# Altium footprint library PCB_Connector.PcbLib: 65 footprints (part 4 of 5)
Each footprint in its own frame and in the unit in brackets; x right, y up, seen from the top. Pads: shape width x height; smd on the part's side, far side on the other; paste and mask are expansions set on the pad; w line width, h text height; cw(c..) or ccw(c..) is an arc to the next point about the centre after c.
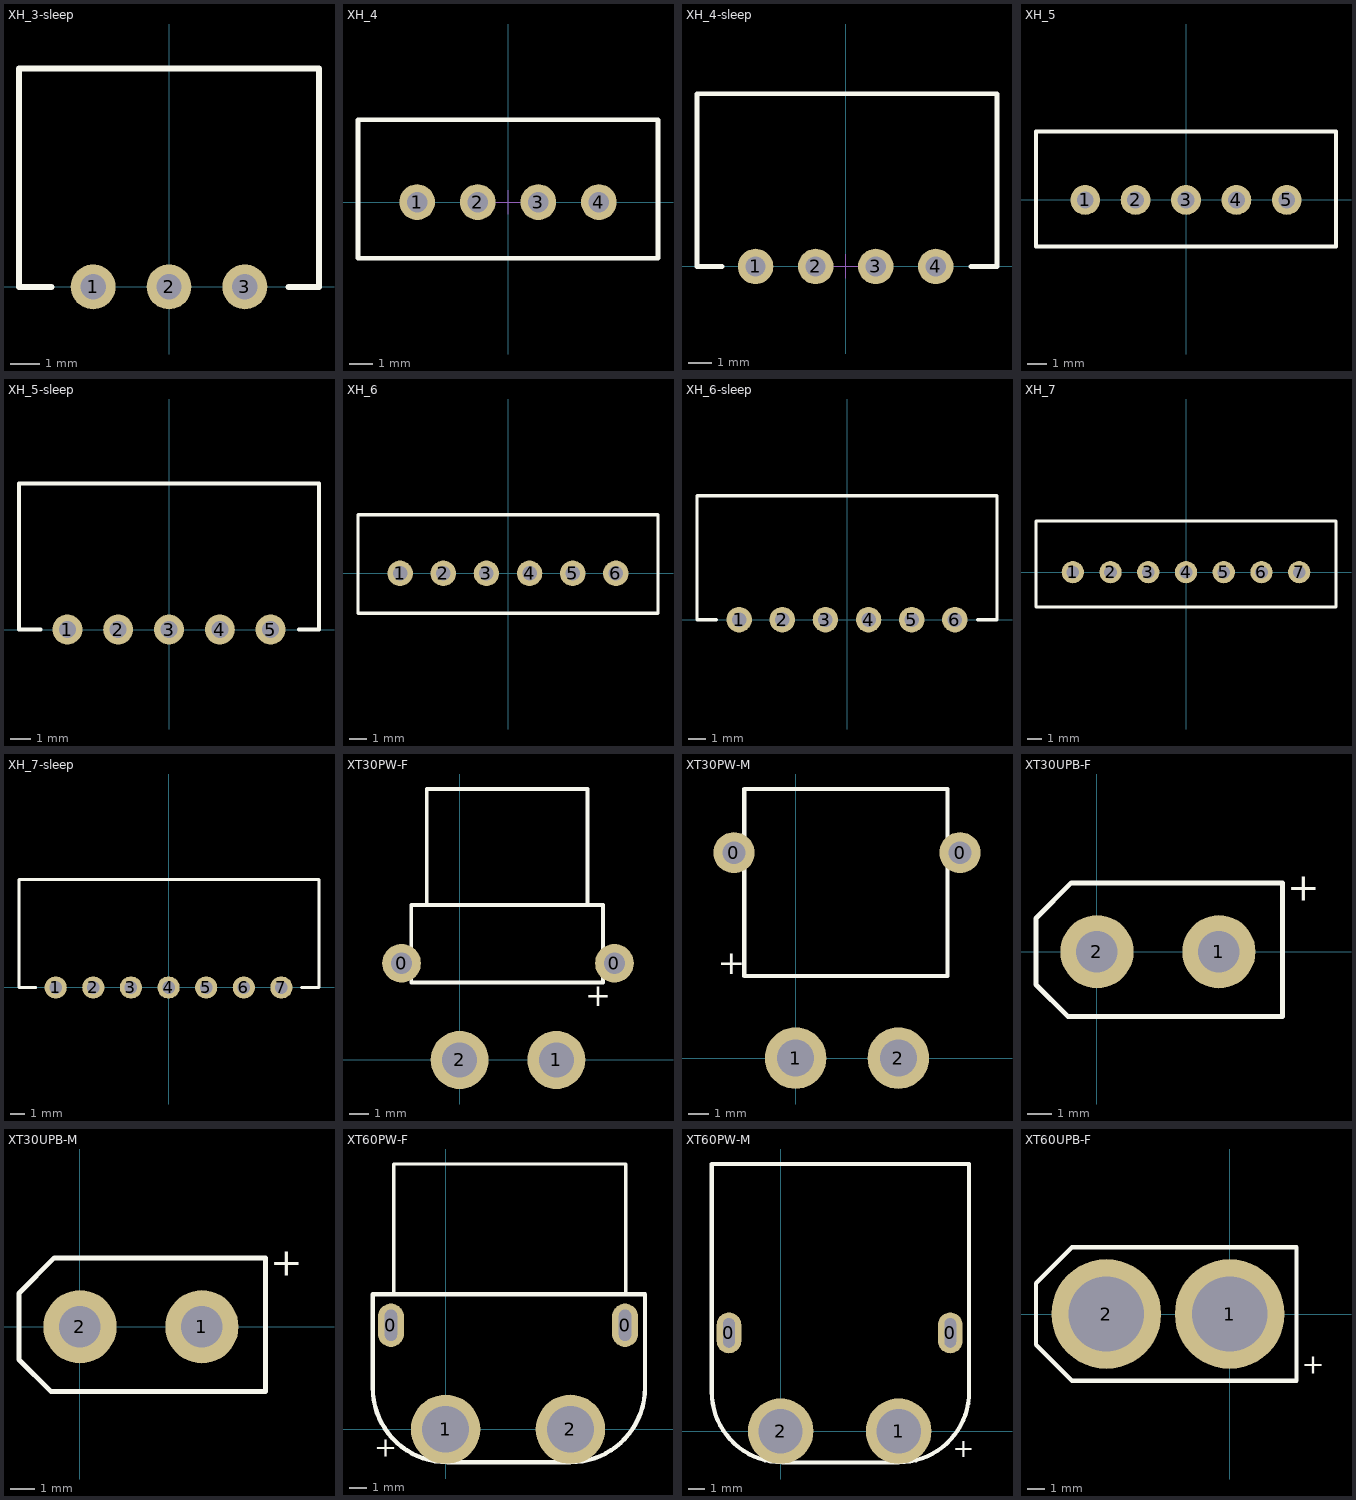
[diagram p3: the footprints below, top view; thin cyan lines are the x and y axes]

## XH_3-sleep [mm]
pads (3):
  round 1.5 hole 0.85: 1(-2.54,0) 2(0,0) 3(2.54,0)
Top Overlay:
  lines w0.2: -5.02,0 -5.02,7.3 5.02,7.3 5.02,0 ; -5,0 -3.93,0 ; 4,0 5,0
3D body "JST-XH-2.5mm-3P.STEP": height 5.95, standoff -3.35, extent -5,-0.34 5,7.3

## XH_4 [mm]
pads (4):
  round 1.5 hole 0.85: 1(-3.81,0) 2(-1.27,0) 3(1.27,0) 4(3.81,0)
Top Overlay:
  lines w0.2: -6.29,-2.35 6.29,-2.35 6.29,3.45 -6.29,3.45 -6.29,-2.35
Top Assembly (Mech13):
  lines w0.051: -0.508,0 0.508,0 ; 0,-0.508 0,0.508
3D body "XH(middle).STEP": height 7.2, standoff -3.2, extent 0,-2.35 2.54,3.45
3D body "XH(middle).STEP": height 7.2, standoff -3.2, extent -2.54,-2.35 0,3.45
3D body "XH(right).STEP": height 7.2, standoff -3.2, extent 2.54,-2.35 6.29,3.45
3D body "XH(left).STEP": height 7.2, standoff -3.2, extent -6.29,-2.35 -2.54,3.45

## XH_4-sleep [mm]
pads (4):
  round 1.5 hole 0.85: 1(-3.81,0) 2(-1.27,0) 3(1.27,0) 4(3.81,0)
Top Overlay:
  lines w0.2: -5.23,0 -6.29,0 -6.29,7.3 6.4,7.3 6.4,0 5.3,0
Top Assembly (Mech13):
  lines w0.051: -0.508,0 0.508,0 ; 0,-0.508 0,0.508
3D body: height 5.8, standoff 0, extent -6.3,0 6.3,7.3

## XH_5 [mm]
pads (5):
  round 1.5 hole 0.85: 1(-5.08,0) 2(-2.54,0) 3(0,0) 4(2.54,0) 5(5.08,0)
Top Overlay:
  lines w0.2: -7.56,-2.35 -7.56,3.45 7.56,3.45 7.56,-2.35 -7.56,-2.35
3D body "XH(left).STEP": height 7.2, standoff -3.2, extent -7.56,-2.35 -3.81,3.45
3D body "XH(right).STEP": height 7.2, standoff -3.2, extent 3.81,-2.35 7.56,3.45
3D body "XH(middle).STEP": height 7.2, standoff -3.2, extent -3.81,-2.35 -1.27,3.45
3D body "XH(middle).STEP": height 7.2, standoff -3.2, extent -1.27,-2.35 1.27,3.45
3D body "XH(middle).STEP": height 7.2, standoff -3.2, extent 1.27,-2.35 3.81,3.45

## XH_5-sleep [mm]
pads (5):
  round 1.5 hole 0.85: 1(-5.08,0) 2(-2.54,0) 3(0,0) 4(2.54,0) 5(5.08,0)
Top Overlay:
  lines w0.2: -6.43,0 -7.5,0 -7.5,7.3 7.5,7.3 7.5,0 6.5,0
3D body: height 5.8, standoff 0, extent -7.5,0 7.5,7.3

## XH_6 [mm]
pads (6):
  round 1.5 hole 0.85: 1(-6.35,0) 2(-3.81,0) 3(-1.27,0) 4(1.27,0) 5(3.81,0) 6(6.35,0)
Top Overlay:
  lines w0.2: -8.83,-2.35 -8.83,3.45 8.83,3.45 8.83,-2.35 -8.83,-2.35
3D body "XH(middle).STEP": height 7.2, standoff -3.2, extent 0,-2.35 2.54,3.45
3D body "XH(left).STEP": height 7.2, standoff -3.2, extent -8.83,-2.35 -5.08,3.45
3D body "XH(right).STEP": height 7.2, standoff -3.2, extent 5.08,-2.35 8.83,3.45
3D body "XH(middle).STEP": height 7.2, standoff -3.2, extent -5.08,-2.35 -2.54,3.45
3D body "XH(middle).STEP": height 7.2, standoff -3.2, extent -2.54,-2.35 0,3.45
3D body "XH(middle).STEP": height 7.2, standoff -3.2, extent 2.54,-2.35 5.08,3.45

## XH_6-sleep [mm]
pads (6):
  round 1.5 hole 0.85: 1(-6.35,0) 2(-3.81,0) 3(-1.27,0) 4(1.27,0) 5(3.81,0) 6(6.35,0)
Top Overlay:
  lines w0.2: -7.7,0 -8.83,0 -8.83,7.3 8.83,7.3 8.83,0 7.7,0
3D body: height 5.8, standoff 0, extent -8.8,0 8.8,7.3

## XH_7 [mm]
pads (7):
  round 1.5 hole 0.85: 1(-7.62,0) 2(-5.08,0) 3(-2.54,0) 4(0,0) 5(2.54,0) 6(5.08,0) 7(7.62,0)
Top Overlay:
  lines w0.2: -10.1,-2.35 10.1,-2.35 10.1,3.45 -10.1,3.45 -10.1,-2.35
3D body "XH(middle).STEP": height 7.2, standoff -3.2, extent 3.81,-2.35 6.35,3.45
3D body "XH(middle).STEP": height 7.2, standoff -3.2, extent 1.27,-2.35 3.81,3.45
3D body "XH(middle).STEP": height 7.2, standoff -3.2, extent -1.27,-2.35 1.27,3.45
3D body "XH(middle).STEP": height 7.2, standoff -3.2, extent -3.81,-2.35 -1.27,3.45
3D body "XH(middle).STEP": height 7.2, standoff -3.2, extent -6.35,-2.35 -3.81,3.45
3D body "XH(right).STEP": height 7.2, standoff -3.2, extent 6.35,-2.35 10.1,3.45
3D body "XH(left).STEP": height 7.2, standoff -3.2, extent -10.1,-2.35 -6.35,3.45

## XH_7-sleep [mm]
pads (7):
  round 1.5 hole 0.85: 1(-7.62,0) 2(-5.08,0) 3(-2.54,0) 4(0,0) 5(2.54,0) 6(5.08,0) 7(7.62,0)
Top Overlay:
  lines w0.2: -8.97,0 -10.1,0 -10.1,7.3 10.16,7.3 10.16,0 8.97,0
3D body: height 5.8, standoff 0, extent -10.07,0 10.16,7.3

## XT30PW-F [mm]
pads (4):
  round 2 hole 1.1: 0(-3,5) 0(8,5)
  round 3 hole 1.8: 1(5,0) 2(0,0)
Top Overlay:
  lines w0.2: -1.7,8 -1.7,14 6.6,14 6.6,8 ; -2.5,4 -2.5,8 7.4,8 7.4,4 -2.5,4
  text "+" at 6.5,2.4 h2
3D body "XT30PW-F.STEP": height 5.1, standoff -2.05, extent -4.15,-0.9 9.15,14

## XT30PW-M [mm]
pads (4):
  round 2 hole 1.1: 0(-3,10) 0(8,10)
  round 3 hole 1.8: 1(0,0) 2(5,0)
Top Overlay:
  lines w0.2: -2.5,4 7.4,4 7.4,13.1 -2.5,13.1 -2.5,4
  text "+" at -3.8,3.7 h2
3D body "XT30PW-M.STEP": height 5.15, standoff -2.05, extent -4.2,-0.875 9.1,13.075

## XT30UPB-F [mm]
pads (2):
  round 3 hole 1.7: 1(5,0) 2(0,0)
Top Overlay:
  lines w0.2: -2.5,-1.35 -1.2,-2.65 7.6,-2.65 7.6,2.825 -1.05,2.825 -2.5,1.375 -2.5,-1.35
  text "+" at 7.8,1.7 h2
3D body "XT30UPB-F.STEP": height 9.4, standoff -2, extent -2.575,-2.713 7.625,2.887

## XT30UPB-M [mm]
pads (2):
  round 3 hole 1.7: 1(5,0) 2(0,0)
Top Overlay:
  lines w0.2: -2.5,-1.35 -1.2,-2.65 7.6,-2.65 7.6,2.825 -1.05,2.825 -2.5,1.375 -2.5,-1.35
  text "+" at 7.8,1.7 h2
3D body "XT30UPB-M.STEP": height 10.68, standoff -2.02, extent -2.576,-2.713 7.624,2.887

## XT60PW-F [mm]
pads (4):
  oval 1.5x2.5 hole 0.7 slot 1.8 at 90 deg: 0(-3.15,6) 0(10.35,6)
  round 4 hole 2.7: 1(0,0) 2(7.2,0)
Top Overlay:
  lines w0.2: -3,7.8 -3,15.3 10.4,15.3 10.4,7.8
  lines w0.254: -4.2,2.4 ccw(c0.1,2.4) 0.1,-1.9 7.2,-1.9 ccw(c7.2,2.4) 11.5,2.4 11.5,7.8 -4.2,7.8 -4.2,2.4
  text "+" at -4.1,-2 h2
3D body "XT60PW-M.STEP": height 8.45, standoff -2.05, extent -4.3,-1.95 11.6,15.35

## XT60PW-M [mm]
pads (4):
  oval 1.5x2.5 hole 0.7 slot 1.8 at 90 deg: 0(-3.15,6) 0(10.35,6)
  round 4 hole 2.7: 1(7.2,0) 2(0,0)
Top Overlay:
  lines w0.254: -4.2,2.4 ccw(c0.1,2.4) 0.1,-1.9 7.2,-1.9 ccw(c7.2,2.4) 11.5,2.4 11.5,16.3 -4.2,16.3 -4.2,2.4
  text "+" at 10.5,-2 h2
3D body "XT60PW-F.STEP": height 8.45, standoff -2.05, extent -4.3,-1.95 11.6,16.35

## XT60UPB-F [mm]
pads (2):
  round 6.4 hole 4.4: 1(0,0) 2(-7.2,0)
Top Overlay:
  lines w0.254: -11.3,-1.8 -9.2,-3.9 3.9,-3.9 3.9,3.9 -9.2,3.9 -11.3,1.8 -11.3,-1.8
  text "+" at 4.2,-3.9 h2
3D body "XT60UPB-M.STEP": height 13.7, standoff -1.9, extent -11.356,-3.95 3.944,3.95